# Altium integrated library TerminalBlocksPluggable_5.08mm.IntLib: 266 symbols (part 1 of 2)
Pins are listed as number, name and electrical type; pins without a type are passive.

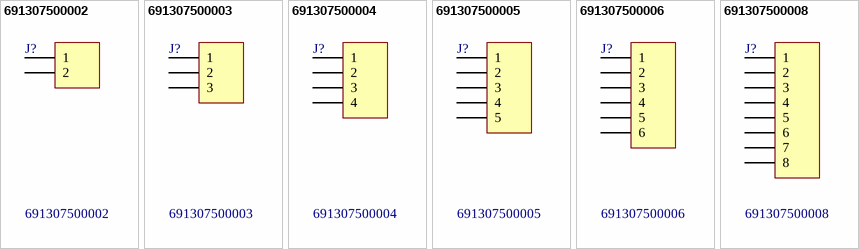
[diagram p0: symbols 691307500002 to 691307500008]

## 691307500002
designator J?
WR-TBL Terminal block - serie 3075; Manufacturer: Würth Elektronik eiSos GmbH; ComponentLink1 Description: Manufacturer; ComponentLink2 Description: Datasheet; NoPins: 02; Created Date: 09 April 2014; partNo: 691307500002; ComponentLink1URL: http://www.we-online.com; ComponentLink2URL: http://katalog.we-online.de/em/datasheet/6913075000xx.pdf; Created by: Karrer Zheng; Value: 691307500002
footprint 691307500002 (5.08 mm Reversed Gender Vertical PCB Header - 02p)
pins: 1, 2

## 691307500003
designator J?
WR-TBL Terminal block - serie 3075; Manufacturer: Würth Elektronik eiSos GmbH; ComponentLink1 Description: Manufacturer; ComponentLink2 Description: Datasheet; NoPins: 03; Created Date: 09 April 2014; partNo: 691307500003; ComponentLink1URL: http://www.we-online.com; ComponentLink2URL: http://katalog.we-online.de/em/datasheet/6913075000xx.pdf; Created by: Karrer Zheng; Value: 691307500003
footprint 691307500003 (5.08 mm Reversed Gender Vertical PCB Header - 03p)
pins: 1, 2, 3

## 691307500004
designator J?
WR-TBL Terminal block - serie 3075; Manufacturer: Würth Elektronik eiSos GmbH; ComponentLink1 Description: Manufacturer; ComponentLink2 Description: Datasheet; NoPins: 04; Created Date: 09 April 2014; partNo: 691307500004; ComponentLink1URL: http://www.we-online.com; ComponentLink2URL: http://katalog.we-online.de/em/datasheet/6913075000xx.pdf; Created by: Karrer Zheng; Value: 691307500004
footprint 691307500004 (5.08 mm Reversed Gender Vertical PCB Header - 04p)
pins: 1, 2, 3, 4

## 691307500005
designator J?
WR-TBL Terminal block - serie 3075; Manufacturer: Würth Elektronik eiSos GmbH; ComponentLink1 Description: Manufacturer; ComponentLink2 Description: Datasheet; NoPins: 05; Created Date: 09 April 2014; partNo: 691307500005; ComponentLink1URL: http://www.we-online.com; ComponentLink2URL: http://katalog.we-online.de/em/datasheet/6913075000xx.pdf; Created by: Karrer Zheng; Value: 691307500005
footprint 691307500005 (5.08 mm Reversed Gender Vertical PCB Header - 05p)
pins: 1, 2, 3, 4, 5

## 691307500006
designator J?
WR-TBL Terminal block - serie 3075; Manufacturer: Würth Elektronik eiSos GmbH; ComponentLink1 Description: Manufacturer; ComponentLink2 Description: Datasheet; NoPins: 06; Created Date: 09 April 2014; partNo: 691307500006; ComponentLink1URL: http://www.we-online.com; ComponentLink2URL: http://katalog.we-online.de/em/datasheet/6913075000xx.pdf; Created by: Karrer Zheng; Value: 691307500006
footprint 691307500006 (5.08 mm Reversed Gender Vertical PCB Header - 06p)
pins: 1, 2, 3, 4, 5, 6

## 691307500008
designator J?
WR-TBL Terminal block - serie 3075; Manufacturer: Würth Elektronik eiSos GmbH; ComponentLink1 Description: Manufacturer; ComponentLink2 Description: Datasheet; NoPins: 08; Created Date: 09 April 2014; partNo: 691307500008; ComponentLink1URL: http://www.we-online.com; ComponentLink2URL: http://katalog.we-online.de/em/datasheet/6913075000xx.pdf; Created by: Karrer Zheng; Value: 691307500008
footprint 691307500008 (5.08 mm Reversed Gender Vertical PCB Header - 08p)
pins: 1, 2, 3, 4, 5, 6, 7, 8


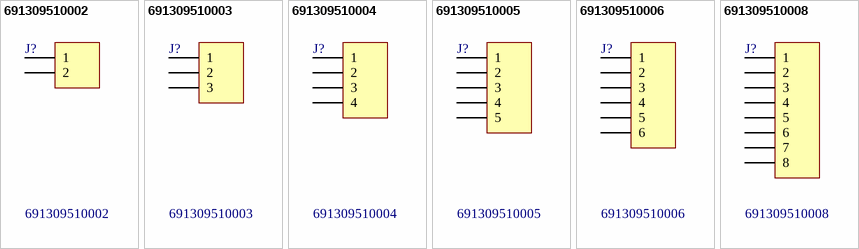
[diagram p1: symbols 691309510002 to 691309510008]

## 691309510002
designator J?
WR-TBL Terminal block - serie 3095; Manufacturer: Würth Elektronik eiSos GmbH; ComponentLink1 Description: Manufacturer; ComponentLink2 Description: Datasheet; NoPins: 02; Created Date: 09 April 2014; partNo: 691309510002; ComponentLink1URL: http://www.we-online.com; ComponentLink2URL: http://katalog.we-online.de/em/datasheet/6913095100xx.pdf; Created by: Karrer Zheng; Value: 691309510002
footprint 691309510002 (5.08 mm Reversed Gender Horizontal PCB Header - 02p)
pins: 1, 2

## 691309510003
designator J?
WR-TBL Terminal block - serie 3095; Manufacturer: Würth Elektronik eiSos GmbH; ComponentLink1 Description: Manufacturer; ComponentLink2 Description: Datasheet; NoPins: 03; Created Date: 09 April 2014; partNo: 691309510003; ComponentLink1URL: http://www.we-online.com; ComponentLink2URL: http://katalog.we-online.de/em/datasheet/6913095100xx.pdf; Created by: Karrer Zheng; Value: 691309510003
footprint 691309510003 (5.08 mm Reversed Gender Horizontal PCB Header - 03p)
pins: 1, 2, 3

## 691309510004
designator J?
WR-TBL Terminal block - serie 3095; Manufacturer: Würth Elektronik eiSos GmbH; ComponentLink1 Description: Manufacturer; ComponentLink2 Description: Datasheet; NoPins: 04; Created Date: 09 April 2014; partNo: 691309510004; ComponentLink1URL: http://www.we-online.com; ComponentLink2URL: http://katalog.we-online.de/em/datasheet/6913095100xx.pdf; Created by: Karrer Zheng; Value: 691309510004
footprint 691309510004 (5.08 mm Reversed Gender Horizontal PCB Header - 04p)
pins: 1, 2, 3, 4

## 691309510005
designator J?
WR-TBL Terminal block - serie 3095; Manufacturer: Würth Elektronik eiSos GmbH; ComponentLink1 Description: Manufacturer; ComponentLink2 Description: Datasheet; NoPins: 05; Created Date: 09 April 2014; partNo: 691309510005; ComponentLink1URL: http://www.we-online.com; ComponentLink2URL: http://katalog.we-online.de/em/datasheet/6913095100xx.pdf; Created by: Karrer Zheng; Value: 691309510005
footprint 691309510005 (5.08 mm Reversed Gender Horizontal PCB Header - 05p)
pins: 1, 2, 3, 4, 5

## 691309510006
designator J?
WR-TBL Terminal block - serie 3095; Manufacturer: Würth Elektronik eiSos GmbH; ComponentLink1 Description: Manufacturer; ComponentLink2 Description: Datasheet; NoPins: 06; Created Date: 09 April 2014; partNo: 691309510006; ComponentLink1URL: http://www.we-online.com; ComponentLink2URL: http://katalog.we-online.de/em/datasheet/6913095100xx.pdf; Created by: Karrer Zheng; Value: 691309510006
footprint 691309510006 (5.08 mm Reversed Gender Horizontal PCB Header - 06p)
pins: 1, 2, 3, 4, 5, 6

## 691309510008
designator J?
WR-TBL Terminal block - serie 3095; Manufacturer: Würth Elektronik eiSos GmbH; ComponentLink1 Description: Manufacturer; ComponentLink2 Description: Datasheet; NoPins: 08; Created Date: 09 April 2014; partNo: 691309510008; ComponentLink1URL: http://www.we-online.com; ComponentLink2URL: http://katalog.we-online.de/em/datasheet/6913095100xx.pdf; Created by: Karrer Zheng; Value: 691309510008
footprint 691309510008 (5.08 mm Reversed Gender Horizontal PCB Header - 08p)
pins: 1, 2, 3, 4, 5, 6, 7, 8


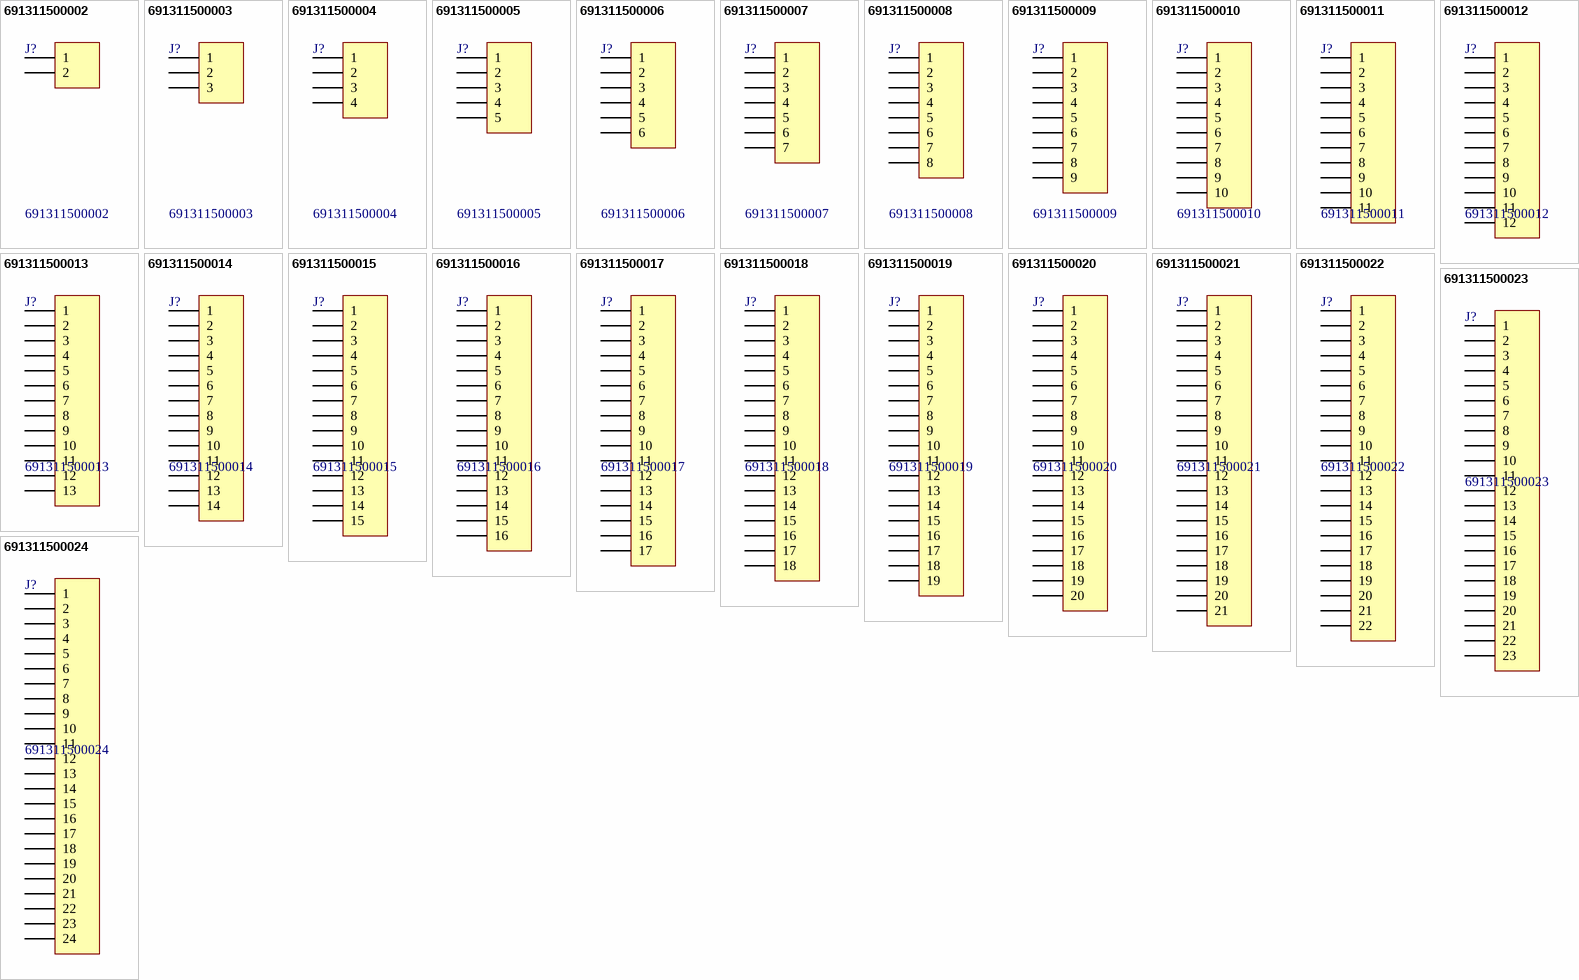
[diagram p2: symbols 691311500002 to 691311500024]

## 691311500002
designator J?
WR-TBL Terminal block - serie 311 - 5.08mm; Manufacturer: Würth Elektronik eiSos GmbH; ComponentLink1 Description: Manufacturer; ComponentLink2 Description: Datasheet; NoPins: 02; Created Date: 9 January 2014; partNo: 691311500002; ComponentLink1URL: http://www.we-online.com; ComponentLink2URL: http://katalog.we-online.de/em/datasheet/6913115000xx.pdf; Created by: Karrer Zheng; Value: 691311500002
footprint 691311500002 (5,08mm - PCB Headers - Vertical - Opened ends -02p)
pins: 1, 2

## 691311500003
designator J?
WR-TBL Terminal block - serie 311 - 5.08mm; Manufacturer: Würth Elektronik eiSos GmbH; ComponentLink1 Description: Manufacturer; ComponentLink2 Description: Datasheet; NoPins: 03; Created Date: 9 January 2014; partNo: 691311500003; ComponentLink1URL: http://www.we-online.com; ComponentLink2URL: http://katalog.we-online.de/em/datasheet/6913115000xx.pdf; Created by: Karrer Zheng; Value: 691311500003
footprint 691311500003 (5,08mm - PCB Headers - Vertical - Opened ends -03p)
pins: 1, 2, 3

## 691311500004
designator J?
WR-TBL Terminal block - serie 311 - 5.08mm; Manufacturer: Würth Elektronik eiSos GmbH; ComponentLink1 Description: Manufacturer; ComponentLink2 Description: Datasheet; NoPins: 04; Created Date: 9 January 2014; partNo: 691311500004; ComponentLink1URL: http://www.we-online.com; ComponentLink2URL: http://katalog.we-online.de/em/datasheet/6913115000xx.pdf; Created by: Karrer Zheng; Value: 691311500004
footprint 691311500004 (5,08mm - PCB Headers - Vertical - Opened ends -04p)
pins: 1, 2, 3, 4

## 691311500005
designator J?
WR-TBL Terminal block - serie 311 - 5.08mm; Manufacturer: Würth Elektronik eiSos GmbH; ComponentLink1 Description: Manufacturer; ComponentLink2 Description: Datasheet; NoPins: 05; Created Date: 9 January 2014; partNo: 691311500005; ComponentLink1URL: http://www.we-online.com; ComponentLink2URL: http://katalog.we-online.de/em/datasheet/6913115000xx.pdf; Created by: Karrer Zheng; Value: 691311500005
footprint 691311500005 (5,08mm - PCB Headers - Vertical - Opened ends -05p)
pins: 1, 2, 3, 4, 5

## 691311500006
designator J?
WR-TBL Terminal block - serie 311 - 5.08mm; Manufacturer: Würth Elektronik eiSos GmbH; ComponentLink1 Description: Manufacturer; ComponentLink2 Description: Datasheet; NoPins: 06; Created Date: 9 January 2014; partNo: 691311500006; ComponentLink1URL: http://www.we-online.com; ComponentLink2URL: http://katalog.we-online.de/em/datasheet/6913115000xx.pdf; Created by: Karrer Zheng; Value: 691311500006
footprint 691311500006 (5,08mm - PCB Headers - Vertical - Opened ends -06p)
pins: 1, 2, 3, 4, 5, 6

## 691311500007
designator J?
WR-TBL Terminal block - serie 311 - 5.08mm; Manufacturer: Würth Elektronik eiSos GmbH; ComponentLink1 Description: Manufacturer; ComponentLink2 Description: Datasheet; NoPins: 07; Created Date: 9 January 2014; partNo: 691311500007; ComponentLink1URL: http://www.we-online.com; ComponentLink2URL: http://katalog.we-online.de/em/datasheet/6913115000xx.pdf; Created by: Karrer Zheng; Value: 691311500007
footprint 691311500007 (5,08mm - PCB Headers - Vertical - Opened ends -07p)
pins: 1, 2, 3, 4, 5, 6, 7

## 691311500008
designator J?
WR-TBL Terminal block - serie 311 - 5.08mm; Manufacturer: Würth Elektronik eiSos GmbH; ComponentLink1 Description: Manufacturer; ComponentLink2 Description: Datasheet; NoPins: 08; Created Date: 9 January 2014; partNo: 691311500008; ComponentLink1URL: http://www.we-online.com; ComponentLink2URL: http://katalog.we-online.de/em/datasheet/6913115000xx.pdf; Created by: Karrer Zheng; Value: 691311500008
footprint 691311500008 (5,08mm - PCB Headers - Vertical - Opened ends -08p)
pins: 1, 2, 3, 4, 5, 6, 7, 8

## 691311500009
designator J?
WR-TBL Terminal block - serie 311 - 5.08mm; Manufacturer: Würth Elektronik eiSos GmbH; ComponentLink1 Description: Manufacturer; ComponentLink2 Description: Datasheet; NoPins: 09; Created Date: 9 January 2014; partNo: 691311500009; ComponentLink1URL: http://www.we-online.com; ComponentLink2URL: http://katalog.we-online.de/em/datasheet/6913115000xx.pdf; Created by: Karrer Zheng; Value: 691311500009
footprint 691311500009 (5,08mm - PCB Headers - Vertical - Opened ends -09p)
pins: 1, 2, 3, 4, 5, 6, 7, 8, 9

## 691311500010
designator J?
WR-TBL Terminal block - serie 311 - 5.08mm; Manufacturer: Würth Elektronik eiSos GmbH; ComponentLink1 Description: Manufacturer; ComponentLink2 Description: Datasheet; NoPins: 10; Created Date: 9 January 2014; partNo: 691311500010; ComponentLink1URL: http://www.we-online.com; ComponentLink2URL: http://katalog.we-online.de/em/datasheet/6913115000xx.pdf; Created by: Karrer Zheng; Value: 691311500010
footprint 691311500010 (5,08mm - PCB Headers - Vertical - Opened ends -10p)
pins: 1, 2, 3, 4, 5, 6, 7, 8, 9, 10

## 691311500011
designator J?
WR-TBL Terminal block - serie 311 - 5.08mm; Manufacturer: Würth Elektronik eiSos GmbH; ComponentLink1 Description: Manufacturer; ComponentLink2 Description: Datasheet; NoPins: 11; Created Date: 9 January 2014; partNo: 691311500011; ComponentLink1URL: http://www.we-online.com; ComponentLink2URL: http://katalog.we-online.de/em/datasheet/6913115000xx.pdf; Created by: Karrer Zheng; Value: 691311500011
footprint 691311500011 (5,08mm - PCB Headers - Vertical - Opened ends -11p)
pins: 1, 2, 3, 4, 5, 6, 7, 8, 9, 10, 11

## 691311500012
designator J?
WR-TBL Terminal block - serie 311 - 5.08mm; Manufacturer: Würth Elektronik eiSos GmbH; ComponentLink1 Description: Manufacturer; ComponentLink2 Description: Datasheet; NoPins: 12; Created Date: 9 January 2014; partNo: 691311500012; ComponentLink1URL: http://www.we-online.com; ComponentLink2URL: http://katalog.we-online.de/em/datasheet/6913115000xx.pdf; Created by: Karrer Zheng; Value: 691311500012
footprint 691311500012 (5,08mm - PCB Headers - Vertical - Opened ends -12p)
pins: 1, 2, 3, 4, 5, 6, 7, 8, 9, 10, 11, 12

## 691311500013
designator J?
WR-TBL Terminal block - serie 311 - 5.08mm; Manufacturer: Würth Elektronik eiSos GmbH; ComponentLink1 Description: Manufacturer; ComponentLink2 Description: Datasheet; NoPins: 13; Created Date: 9 January 2014; partNo: 691311500013; ComponentLink1URL: http://www.we-online.com; ComponentLink2URL: http://katalog.we-online.de/em/datasheet/6913115000xx.pdf; Created by: Karrer Zheng; Value: 691311500013
footprint 691311500013 (5,08mm - PCB Headers - Vertical - Opened ends -13p)
pins: 1, 2, 3, 4, 5, 6, 7, 8, 9, 10, 11, 12, 13

## 691311500014
designator J?
WR-TBL Terminal block - serie 311 - 5.08mm; Manufacturer: Würth Elektronik eiSos GmbH; ComponentLink1 Description: Manufacturer; ComponentLink2 Description: Datasheet; NoPins: 14; Created Date: 9 January 2014; partNo: 691311500014; ComponentLink1URL: http://www.we-online.com; ComponentLink2URL: http://katalog.we-online.de/em/datasheet/6913115000xx.pdf; Created by: Karrer Zheng; Value: 691311500014
footprint 691311500014 (5,08mm - PCB Headers - Vertical - Opened ends -14p)
pins: 1, 2, 3, 4, 5, 6, 7, 8, 9, 10, 11, 12, 13, 14

## 691311500015
designator J?
WR-TBL Terminal block - serie 311 - 5.08mm; Manufacturer: Würth Elektronik eiSos GmbH; ComponentLink1 Description: Manufacturer; ComponentLink2 Description: Datasheet; NoPins: 15; Created Date: 9 January 2014; partNo: 691311500015; ComponentLink1URL: http://www.we-online.com; ComponentLink2URL: http://katalog.we-online.de/em/datasheet/6913115000xx.pdf; Created by: Karrer Zheng; Value: 691311500015
footprint 691311500015 (5,08mm - PCB Headers - Vertical - Opened ends -15p)
pins: 1, 2, 3, 4, 5, 6, 7, 8, 9, 10, 11, 12, 13, 14, 15

## 691311500016
designator J?
WR-TBL Terminal block - serie 311 - 5.08mm; Manufacturer: Würth Elektronik eiSos GmbH; ComponentLink1 Description: Manufacturer; ComponentLink2 Description: Datasheet; NoPins: 16; Created Date: 9 January 2014; partNo: 691311500016; ComponentLink1URL: http://www.we-online.com; ComponentLink2URL: http://katalog.we-online.de/em/datasheet/6913115000xx.pdf; Created by: Karrer Zheng; Value: 691311500016
footprint 691311500016 (5,08mm - PCB Headers - Vertical - Opened ends -16p)
pins: 1, 2, 3, 4, 5, 6, 7, 8, 9, 10, 11, 12, 13, 14, 15, 16

## 691311500017
designator J?
WR-TBL Terminal block - serie 311 - 5.08mm; Manufacturer: Würth Elektronik eiSos GmbH; ComponentLink1 Description: Manufacturer; ComponentLink2 Description: Datasheet; NoPins: 17; Created Date: 9 January 2014; partNo: 691311500017; ComponentLink1URL: http://www.we-online.com; ComponentLink2URL: http://katalog.we-online.de/em/datasheet/6913115000xx.pdf; Created by: Karrer Zheng; Value: 691311500017
footprint 691311500017 (5,08mm - PCB Headers - Vertical - Opened ends -17p)
pins: 1, 2, 3, 4, 5, 6, 7, 8, 9, 10, 11, 12, 13, 14, 15, 16, 17

## 691311500018
designator J?
WR-TBL Terminal block - serie 311 - 5.08mm; Manufacturer: Würth Elektronik eiSos GmbH; ComponentLink1 Description: Manufacturer; ComponentLink2 Description: Datasheet; NoPins: 18; Created Date: 9 January 2014; partNo: 691311500018; ComponentLink1URL: http://www.we-online.com; ComponentLink2URL: http://katalog.we-online.de/em/datasheet/6913115000xx.pdf; Created by: Karrer Zheng; Value: 691311500018
footprint 691311500018 (5,08mm - PCB Headers - Vertical - Opened ends -18p)
pins: 1, 2, 3, 4, 5, 6, 7, 8, 9, 10, 11, 12, 13, 14, 15, 16, 17, 18

## 691311500019
designator J?
WR-TBL Terminal block - serie 311 - 5.08mm; Manufacturer: Würth Elektronik eiSos GmbH; ComponentLink1 Description: Manufacturer; ComponentLink2 Description: Datasheet; NoPins: 19; Created Date: 9 January 2014; partNo: 691311500019; ComponentLink1URL: http://www.we-online.com; ComponentLink2URL: http://katalog.we-online.de/em/datasheet/6913115000xx.pdf; Created by: Karrer Zheng; Value: 691311500019
footprint 691311500019 (5,08mm - PCB Headers - Vertical - Opened ends -19p)
pins: 1, 2, 3, 4, 5, 6, 7, 8, 9, 10, 11, 12, 13, 14, 15, 16, 17, 18, 19

## 691311500020
designator J?
WR-TBL Terminal block - serie 311 - 5.08mm; Manufacturer: Würth Elektronik eiSos GmbH; ComponentLink1 Description: Manufacturer; ComponentLink2 Description: Datasheet; NoPins: 20; Created Date: 9 January 2014; partNo: 691311500020; ComponentLink1URL: http://www.we-online.com; ComponentLink2URL: http://katalog.we-online.de/em/datasheet/6913115000xx.pdf; Created by: Karrer Zheng; Value: 691311500020
footprint 691311500020 (5,08mm - PCB Headers - Vertical - Opened ends -20p)
pins: 1, 2, 3, 4, 5, 6, 7, 8, 9, 10, 11, 12, 13, 14, 15, 16, 17, 18, 19, 20

## 691311500021
designator J?
WR-TBL Terminal block - serie 311 - 5.08mm; Manufacturer: Würth Elektronik eiSos GmbH; ComponentLink1 Description: Manufacturer; ComponentLink2 Description: Datasheet; NoPins: 21; Created Date: 9 January 2014; partNo: 691311500021; ComponentLink1URL: http://www.we-online.com; ComponentLink2URL: http://katalog.we-online.de/em/datasheet/6913115000xx.pdf; Created by: Karrer Zheng; Value: 691311500021
footprint 691311500021 (5,08mm - PCB Headers - Vertical - Opened ends -21p)
pins: 1, 2, 3, 4, 5, 6, 7, 8, 9, 10, 11, 12, 13, 14, 15, 16, 17, 18, 19, 20, 21

## 691311500022
designator J?
WR-TBL Terminal block - serie 311 - 5.08mm; Manufacturer: Würth Elektronik eiSos GmbH; ComponentLink1 Description: Manufacturer; ComponentLink2 Description: Datasheet; NoPins: 22; Created Date: 9 January 2014; partNo: 691311500022; ComponentLink1URL: http://www.we-online.com; ComponentLink2URL: http://katalog.we-online.de/em/datasheet/6913115000xx.pdf; Created by: Karrer Zheng; Value: 691311500022
footprint 691311500022 (5,08mm - PCB Headers - Vertical - Opened ends -22p)
pins: 1, 2, 3, 4, 5, 6, 7, 8, 9, 10, 11, 12, 13, 14, 15, 16, 17, 18, 19, 20, 21, 22

## 691311500023
designator J?
WR-TBL Terminal block - serie 311 - 5.08mm; Manufacturer: Würth Elektronik eiSos GmbH; ComponentLink1 Description: Manufacturer; ComponentLink2 Description: Datasheet; NoPins: 23; Created Date: 9 January 2014; partNo: 691311500023; ComponentLink1URL: http://www.we-online.com; ComponentLink2URL: http://katalog.we-online.de/em/datasheet/6913115000xx.pdf; Created by: Karrer Zheng; Value: 691311500023
footprint 691311500023 (5,08mm - PCB Headers - Vertical - Opened ends -23p)
pins: 1, 2, 3, 4, 5, 6, 7, 8, 9, 10, 11, 12, 13, 14, 15, 16, 17, 18, 19, 20, 21, 22, 23

## 691311500024
designator J?
WR-TBL Terminal block - serie 311 - 5.08mm; Manufacturer: Würth Elektronik eiSos GmbH; ComponentLink1 Description: Manufacturer; ComponentLink2 Description: Datasheet; NoPins: 24; Created Date: 9 January 2014; partNo: 691311500024; ComponentLink1URL: http://www.we-online.com; ComponentLink2URL: http://katalog.we-online.de/em/datasheet/6913115000xx.pdf; Created by: Karrer Zheng; Value: 691311500024
footprint 691311500024 (5,08mm - PCB Headers - Vertical - Opened ends -24p)
pins: 1, 2, 3, 4, 5, 6, 7, 8, 9, 10, 11, 12, 13, 14, 15, 16, 17, 18, 19, 20, 21, 22, 23, 24


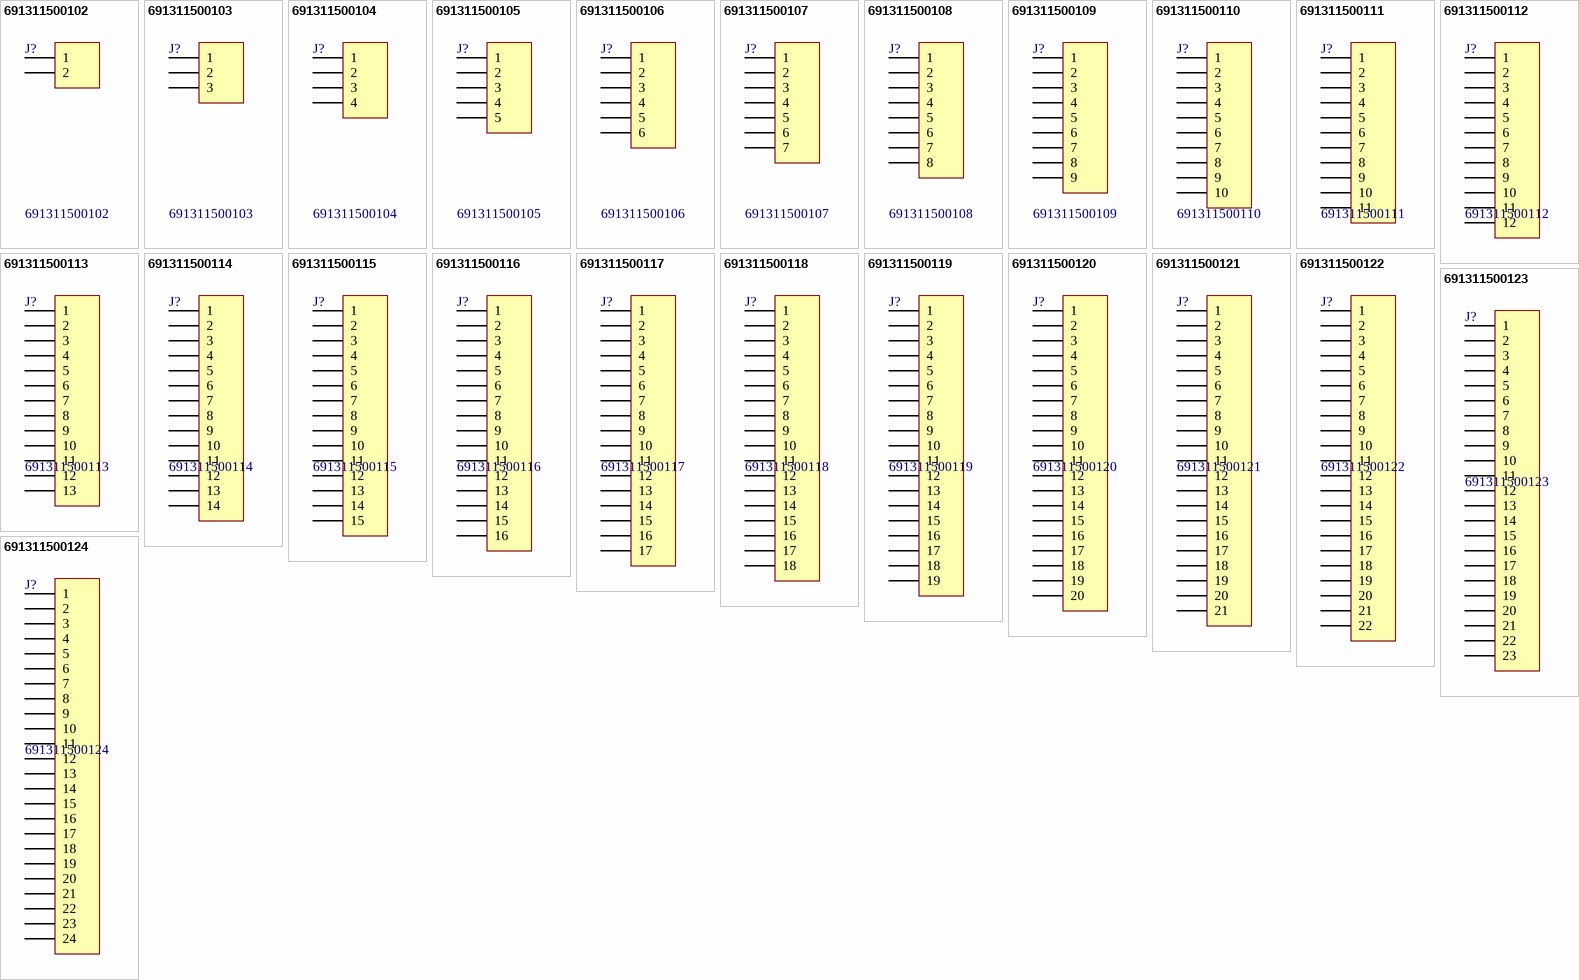
[diagram p3: symbols 691311500102 to 691311500124]

## 691311500102
designator J?
WR-TBL Terminal block - serie 311 Closed - 5.08mm; Manufacturer: Würth Elektronik eiSos GmbH; ComponentLink1 Description: Manufacturer; ComponentLink2 Description: Datasheet; NoPins: 02; Created Date: 8 January 2014; partNo: 691311500102; ComponentLink1URL: http://www.we-online.com; ComponentLink2URL: http://katalog.we-online.de/em/datasheet/6913115001xx.pdf; Created by: Karrer Zheng; Value: 691311500102
footprint 691311500102 (5,08mm - PCB Headers - Vertical - Closed ends -02p)
pins: 1, 2

## 691311500103
designator J?
WR-TBL Terminal block - serie 311 Closed - 5.08mm; Manufacturer: Würth Elektronik eiSos GmbH; ComponentLink1 Description: Manufacturer; ComponentLink2 Description: Datasheet; NoPins: 03; Created Date: 8 January 2014; partNo: 691311500103; ComponentLink1URL: http://www.we-online.com; ComponentLink2URL: http://katalog.we-online.de/em/datasheet/6913115001xx.pdf; Created by: Karrer Zheng; Value: 691311500103
footprint 691311500103 (5,08mm - PCB Headers - Vertical - Closed ends -03p)
pins: 1, 2, 3

## 691311500104
designator J?
WR-TBL Terminal block - serie 311 Closed - 5.08mm; Manufacturer: Würth Elektronik eiSos GmbH; ComponentLink1 Description: Manufacturer; ComponentLink2 Description: Datasheet; NoPins: 04; Created Date: 8 January 2014; partNo: 691311500104; ComponentLink1URL: http://www.we-online.com; ComponentLink2URL: http://katalog.we-online.de/em/datasheet/6913115001xx.pdf; Created by: Karrer Zheng; Value: 691311500104
footprint 691311500104 (5,08mm - PCB Headers - Vertical - Closed ends -04p)
pins: 1, 2, 3, 4

## 691311500105
designator J?
WR-TBL Terminal block - serie 311 Closed - 5.08mm; Manufacturer: Würth Elektronik eiSos GmbH; ComponentLink1 Description: Manufacturer; ComponentLink2 Description: Datasheet; NoPins: 05; Created Date: 8 January 2014; partNo: 691311500105; ComponentLink1URL: http://www.we-online.com; ComponentLink2URL: http://katalog.we-online.de/em/datasheet/6913115001xx.pdf; Created by: Karrer Zheng; Value: 691311500105
footprint 691311500105 (5,08mm - PCB Headers - Vertical - Closed ends -05p)
pins: 1, 2, 3, 4, 5

## 691311500106
designator J?
WR-TBL Terminal block - serie 311 Closed - 5.08mm; Manufacturer: Würth Elektronik eiSos GmbH; ComponentLink1 Description: Manufacturer; ComponentLink2 Description: Datasheet; NoPins: 06; Created Date: 8 January 2014; partNo: 691311500106; ComponentLink1URL: http://www.we-online.com; ComponentLink2URL: http://katalog.we-online.de/em/datasheet/6913115001xx.pdf; Created by: Karrer Zheng; Value: 691311500106
footprint 691311500106 (5,08mm - PCB Headers - Vertical - Closed ends -06p)
pins: 1, 2, 3, 4, 5, 6

## 691311500107
designator J?
WR-TBL Terminal block - serie 311 Closed - 5.08mm; Manufacturer: Würth Elektronik eiSos GmbH; ComponentLink1 Description: Manufacturer; ComponentLink2 Description: Datasheet; NoPins: 07; Created Date: 8 January 2014; partNo: 691311500107; ComponentLink1URL: http://www.we-online.com; ComponentLink2URL: http://katalog.we-online.de/em/datasheet/6913115001xx.pdf; Created by: Karrer Zheng; Value: 691311500107
footprint 691311500107 (5,08mm - PCB Headers - Vertical - Closed ends -07p)
pins: 1, 2, 3, 4, 5, 6, 7

## 691311500108
designator J?
WR-TBL Terminal block - serie 311 Closed - 5.08mm; Manufacturer: Würth Elektronik eiSos GmbH; ComponentLink1 Description: Manufacturer; ComponentLink2 Description: Datasheet; NoPins: 08; Created Date: 8 January 2014; partNo: 691311500108; ComponentLink1URL: http://www.we-online.com; ComponentLink2URL: http://katalog.we-online.de/em/datasheet/6913115001xx.pdf; Created by: Karrer Zheng; Value: 691311500108
footprint 691311500108 (5,08mm - PCB Headers - Vertical - Closed ends -08p)
pins: 1, 2, 3, 4, 5, 6, 7, 8

## 691311500109
designator J?
WR-TBL Terminal block - serie 311 Closed - 5.08mm; Manufacturer: Würth Elektronik eiSos GmbH; ComponentLink1 Description: Manufacturer; ComponentLink2 Description: Datasheet; NoPins: 09; Created Date: 8 January 2014; partNo: 691311500109; ComponentLink1URL: http://www.we-online.com; ComponentLink2URL: http://katalog.we-online.de/em/datasheet/6913115001xx.pdf; Created by: Karrer Zheng; Value: 691311500109
footprint 691311500109 (5,08mm - PCB Headers - Vertical - Closed ends -09p)
pins: 1, 2, 3, 4, 5, 6, 7, 8, 9

## 691311500110
designator J?
WR-TBL Terminal block - serie 311 Closed - 5.08mm; Manufacturer: Würth Elektronik eiSos GmbH; ComponentLink1 Description: Manufacturer; ComponentLink2 Description: Datasheet; NoPins: 10; Created Date: 8 January 2014; partNo: 691311500110; ComponentLink1URL: http://www.we-online.com; ComponentLink2URL: http://katalog.we-online.de/em/datasheet/6913115001xx.pdf; Created by: Karrer Zheng; Value: 691311500110
footprint 691311500110 (5,08mm - PCB Headers - Vertical - Closed ends -10p)
pins: 1, 2, 3, 4, 5, 6, 7, 8, 9, 10

## 691311500111
designator J?
WR-TBL Terminal block - serie 311 Closed - 5.08mm; Manufacturer: Würth Elektronik eiSos GmbH; ComponentLink1 Description: Manufacturer; ComponentLink2 Description: Datasheet; NoPins: 11; Created Date: 8 January 2014; partNo: 691311500111; ComponentLink1URL: http://www.we-online.com; ComponentLink2URL: http://katalog.we-online.de/em/datasheet/6913115001xx.pdf; Created by: Karrer Zheng; Value: 691311500111
footprint 691311500111 (5,08mm - PCB Headers - Vertical - Closed ends -11p)
pins: 1, 2, 3, 4, 5, 6, 7, 8, 9, 10, 11

## 691311500112
designator J?
WR-TBL Terminal block - serie 311 Closed - 5.08mm; Manufacturer: Würth Elektronik eiSos GmbH; ComponentLink1 Description: Manufacturer; ComponentLink2 Description: Datasheet; NoPins: 12; Created Date: 8 January 2014; partNo: 691311500112; ComponentLink1URL: http://www.we-online.com; ComponentLink2URL: http://katalog.we-online.de/em/datasheet/6913115001xx.pdf; Created by: Karrer Zheng; Value: 691311500112
footprint 691311500112 (5,08mm - PCB Headers - Vertical - Closed ends -12p)
pins: 1, 2, 3, 4, 5, 6, 7, 8, 9, 10, 11, 12

## 691311500113
designator J?
WR-TBL Terminal block - serie 311 Closed - 5.08mm; Manufacturer: Würth Elektronik eiSos GmbH; ComponentLink1 Description: Manufacturer; ComponentLink2 Description: Datasheet; NoPins: 13; Created Date: 8 January 2014; partNo: 691311500113; ComponentLink1URL: http://www.we-online.com; ComponentLink2URL: http://katalog.we-online.de/em/datasheet/6913115001xx.pdf; Created by: Karrer Zheng; Value: 691311500113
footprint 691311500113 (5,08mm - PCB Headers - Vertical - Closed ends -13p)
pins: 1, 2, 3, 4, 5, 6, 7, 8, 9, 10, 11, 12, 13

## 691311500114
designator J?
WR-TBL Terminal block - serie 311 Closed - 5.08mm; Manufacturer: Würth Elektronik eiSos GmbH; ComponentLink1 Description: Manufacturer; ComponentLink2 Description: Datasheet; NoPins: 14; Created Date: 8 January 2014; partNo: 691311500114; ComponentLink1URL: http://www.we-online.com; ComponentLink2URL: http://katalog.we-online.de/em/datasheet/6913115001xx.pdf; Created by: Karrer Zheng; Value: 691311500114
footprint 691311500114 (5,08mm - PCB Headers - Vertical - Closed ends -14p)
pins: 1, 2, 3, 4, 5, 6, 7, 8, 9, 10, 11, 12, 13, 14

## 691311500115
designator J?
WR-TBL Terminal block - serie 311 Closed - 5.08mm; Manufacturer: Würth Elektronik eiSos GmbH; ComponentLink1 Description: Manufacturer; ComponentLink2 Description: Datasheet; NoPins: 15; Created Date: 8 January 2014; partNo: 691311500115; ComponentLink1URL: http://www.we-online.com; ComponentLink2URL: http://katalog.we-online.de/em/datasheet/6913115001xx.pdf; Created by: Karrer Zheng; Value: 691311500115
footprint 691311500115 (5,08mm - PCB Headers - Vertical - Closed ends -15p)
pins: 1, 2, 3, 4, 5, 6, 7, 8, 9, 10, 11, 12, 13, 14, 15

## 691311500116
designator J?
WR-TBL Terminal block - serie 311 Closed - 5.08mm; Manufacturer: Würth Elektronik eiSos GmbH; ComponentLink1 Description: Manufacturer; ComponentLink2 Description: Datasheet; NoPins: 16; Created Date: 8 January 2014; partNo: 691311500116; ComponentLink1URL: http://www.we-online.com; ComponentLink2URL: http://katalog.we-online.de/em/datasheet/6913115001xx.pdf; Created by: Karrer Zheng; Value: 691311500116
footprint 691311500116 (5,08mm - PCB Headers - Vertical - Closed ends -16p)
pins: 1, 2, 3, 4, 5, 6, 7, 8, 9, 10, 11, 12, 13, 14, 15, 16

## 691311500117
designator J?
WR-TBL Terminal block - serie 311 Closed - 5.08mm; Manufacturer: Würth Elektronik eiSos GmbH; ComponentLink1 Description: Manufacturer; ComponentLink2 Description: Datasheet; NoPins: 17; Created Date: 8 January 2014; partNo: 691311500117; ComponentLink1URL: http://www.we-online.com; ComponentLink2URL: http://katalog.we-online.de/em/datasheet/6913115001xx.pdf; Created by: Karrer Zheng; Value: 691311500117
footprint 691311500117 (5,08mm - PCB Headers - Vertical - Closed ends -17p)
pins: 1, 2, 3, 4, 5, 6, 7, 8, 9, 10, 11, 12, 13, 14, 15, 16, 17

## 691311500118
designator J?
WR-TBL Terminal block - serie 311 Closed - 5.08mm; Manufacturer: Würth Elektronik eiSos GmbH; ComponentLink1 Description: Manufacturer; ComponentLink2 Description: Datasheet; NoPins: 18; Created Date: 8 January 2014; partNo: 691311500118; ComponentLink1URL: http://www.we-online.com; ComponentLink2URL: http://katalog.we-online.de/em/datasheet/6913115001xx.pdf; Created by: Karrer Zheng; Value: 691311500118
footprint 691311500118 (5,08mm - PCB Headers - Vertical - Closed ends -18p)
pins: 1, 2, 3, 4, 5, 6, 7, 8, 9, 10, 11, 12, 13, 14, 15, 16, 17, 18

## 691311500119
designator J?
WR-TBL Terminal block - serie 311 Closed - 5.08mm; Manufacturer: Würth Elektronik eiSos GmbH; ComponentLink1 Description: Manufacturer; ComponentLink2 Description: Datasheet; NoPins: 19; Created Date: 8 January 2014; partNo: 691311500119; ComponentLink1URL: http://www.we-online.com; ComponentLink2URL: http://katalog.we-online.de/em/datasheet/6913115001xx.pdf; Created by: Karrer Zheng; Value: 691311500119
footprint 691311500119 (5,08mm - PCB Headers - Vertical - Closed ends -19p)
pins: 1, 2, 3, 4, 5, 6, 7, 8, 9, 10, 11, 12, 13, 14, 15, 16, 17, 18, 19

## 691311500120
designator J?
WR-TBL Terminal block - serie 311 Closed - 5.08mm; Manufacturer: Würth Elektronik eiSos GmbH; ComponentLink1 Description: Manufacturer; ComponentLink2 Description: Datasheet; NoPins: 20; Created Date: 8 January 2014; partNo: 691311500120; ComponentLink1URL: http://www.we-online.com; ComponentLink2URL: http://katalog.we-online.de/em/datasheet/6913115001xx.pdf; Created by: Karrer Zheng; Value: 691311500120
footprint 691311500120 (5,08mm - PCB Headers - Vertical - Closed ends -20p)
pins: 1, 2, 3, 4, 5, 6, 7, 8, 9, 10, 11, 12, 13, 14, 15, 16, 17, 18, 19, 20

## 691311500121
designator J?
WR-TBL Terminal block - serie 311 Closed - 5.08mm; Manufacturer: Würth Elektronik eiSos GmbH; ComponentLink1 Description: Manufacturer; ComponentLink2 Description: Datasheet; NoPins: 21; Created Date: 8 January 2014; partNo: 691311500121; ComponentLink1URL: http://www.we-online.com; ComponentLink2URL: http://katalog.we-online.de/em/datasheet/6913115001xx.pdf; Created by: Karrer Zheng; Value: 691311500121
footprint 691311500121 (5,08mm - PCB Headers - Vertical - Closed ends -21p)
pins: 1, 2, 3, 4, 5, 6, 7, 8, 9, 10, 11, 12, 13, 14, 15, 16, 17, 18, 19, 20, 21

## 691311500122
designator J?
WR-TBL Terminal block - serie 311 Closed - 5.08mm; Manufacturer: Würth Elektronik eiSos GmbH; ComponentLink1 Description: Manufacturer; ComponentLink2 Description: Datasheet; NoPins: 22; Created Date: 8 January 2014; partNo: 691311500122; ComponentLink1URL: http://www.we-online.com; ComponentLink2URL: http://katalog.we-online.de/em/datasheet/6913115001xx.pdf; Created by: Karrer Zheng; Value: 691311500122
footprint 691311500122 (5,08mm - PCB Headers - Vertical - Closed ends -22p)
pins: 1, 2, 3, 4, 5, 6, 7, 8, 9, 10, 11, 12, 13, 14, 15, 16, 17, 18, 19, 20, 21, 22

## 691311500123
designator J?
WR-TBL Terminal block - serie 311 Closed - 5.08mm; Manufacturer: Würth Elektronik eiSos GmbH; ComponentLink1 Description: Manufacturer; ComponentLink2 Description: Datasheet; NoPins: 23; Created Date: 8 January 2014; partNo: 691311500123; ComponentLink1URL: http://www.we-online.com; ComponentLink2URL: http://katalog.we-online.de/em/datasheet/6913115001xx.pdf; Created by: Karrer Zheng; Value: 691311500123
footprint 691311500123 (5,08mm - PCB Headers - Vertical - Closed ends -23p)
pins: 1, 2, 3, 4, 5, 6, 7, 8, 9, 10, 11, 12, 13, 14, 15, 16, 17, 18, 19, 20, 21, 22, 23

## 691311500124
designator J?
WR-TBL Terminal block - serie 311 Closed - 5.08mm; Manufacturer: Würth Elektronik eiSos GmbH; ComponentLink1 Description: Manufacturer; ComponentLink2 Description: Datasheet; NoPins: 24; Created Date: 8 January 2014; partNo: 691311500124; ComponentLink1URL: http://www.we-online.com; ComponentLink2URL: http://katalog.we-online.de/em/datasheet/6913115001xx.pdf; Created by: Karrer Zheng; Value: 691311500124
footprint 691311500124 (5,08mm - PCB Headers - Vertical - Closed ends -24p)
pins: 1, 2, 3, 4, 5, 6, 7, 8, 9, 10, 11, 12, 13, 14, 15, 16, 17, 18, 19, 20, 21, 22, 23, 24


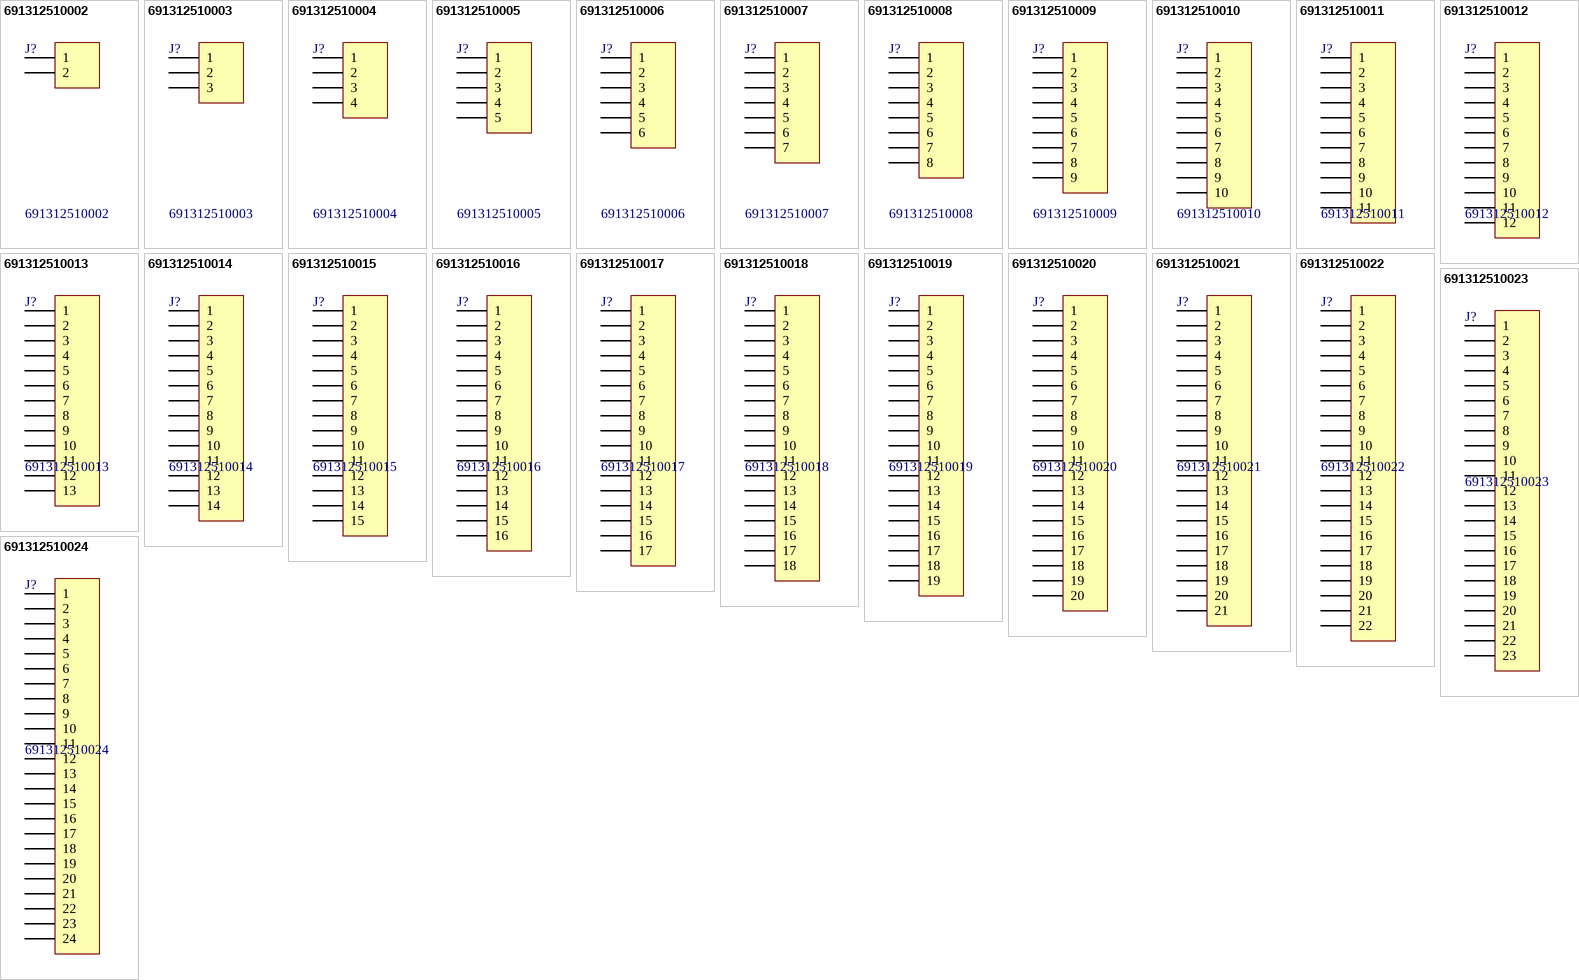
[diagram p4: symbols 691312510002 to 691312510024]

## 691312510002
designator J?
WR-TBL Terminal Blocks Serie 312 – 5.08 mm; Manufacturer: Würth Elektronik eiSos GmbH; ComponentLink1 Description: Manufacturer; ComponentLink2 Description: Datasheet; NoPins: 02; Created Date: 31 March 2014; partNo: 691312510002; ComponentLink1URL: http://www.we-online.com; ComponentLink2URL: http://katalog.we-online.de/em/datasheet/6913125100xx.pdf; Created by: Karrer Zheng; Value: 691312510002
footprint 691312510002 (5,08mm - PCB Headers - Horizontal - Opened ends - 02p)
pins: 1, 2

## 691312510003
designator J?
WR-TBL Terminal Blocks Serie 312 – 5.08 mm; Manufacturer: Würth Elektronik eiSos GmbH; ComponentLink1 Description: Manufacturer; ComponentLink2 Description: Datasheet; NoPins: 03; Created Date: 31 March 2014; partNo: 691312510003; ComponentLink1URL: http://www.we-online.com; ComponentLink2URL: http://katalog.we-online.de/em/datasheet/6913125100xx.pdf; Created by: Karrer Zheng; Value: 691312510003
footprint 691312510003 (5,08mm - PCB Headers - Horizontal - Opened ends - 03p)
pins: 1, 2, 3

## 691312510004
designator J?
WR-TBL Terminal Blocks Serie 312 – 5.08 mm; Manufacturer: Würth Elektronik eiSos GmbH; ComponentLink1 Description: Manufacturer; ComponentLink2 Description: Datasheet; NoPins: 04; Created Date: 31 March 2014; partNo: 691312510004; ComponentLink1URL: http://www.we-online.com; ComponentLink2URL: http://katalog.we-online.de/em/datasheet/6913125100xx.pdf; Created by: Karrer Zheng; Value: 691312510004
footprint 691312510004 (5,08mm - PCB Headers - Horizontal - Opened ends - 04p)
pins: 1, 2, 3, 4

## 691312510005
designator J?
WR-TBL Terminal Blocks Serie 312 – 5.08 mm; Manufacturer: Würth Elektronik eiSos GmbH; ComponentLink1 Description: Manufacturer; ComponentLink2 Description: Datasheet; NoPins: 05; Created Date: 31 March 2014; partNo: 691312510005; ComponentLink1URL: http://www.we-online.com; ComponentLink2URL: http://katalog.we-online.de/em/datasheet/6913125100xx.pdf; Created by: Karrer Zheng; Value: 691312510005
footprint 691312510005 (5,08mm - PCB Headers - Horizontal - Opened ends - 05p)
pins: 1, 2, 3, 4, 5

## 691312510006
designator J?
WR-TBL Terminal Blocks Serie 312 – 5.08 mm; Manufacturer: Würth Elektronik eiSos GmbH; ComponentLink1 Description: Manufacturer; ComponentLink2 Description: Datasheet; NoPins: 06; Created Date: 31 March 2014; partNo: 691312510006; ComponentLink1URL: http://www.we-online.com; ComponentLink2URL: http://katalog.we-online.de/em/datasheet/6913125100xx.pdf; Created by: Karrer Zheng; Value: 691312510006
footprint 691312510006 (5,08mm - PCB Headers - Horizontal - Opened ends - 06p)
pins: 1, 2, 3, 4, 5, 6

## 691312510007
designator J?
WR-TBL Terminal Blocks Serie 312 – 5.08 mm; Manufacturer: Würth Elektronik eiSos GmbH; ComponentLink1 Description: Manufacturer; ComponentLink2 Description: Datasheet; NoPins: 07; Created Date: 31 March 2014; partNo: 691312510007; ComponentLink1URL: http://www.we-online.com; ComponentLink2URL: http://katalog.we-online.de/em/datasheet/6913125100xx.pdf; Created by: Karrer Zheng; Value: 691312510007
footprint 691312510007 (5,08mm - PCB Headers - Horizontal - Opened ends - 07p)
pins: 1, 2, 3, 4, 5, 6, 7

## 691312510008
designator J?
WR-TBL Terminal Blocks Serie 312 – 5.08 mm; Manufacturer: Würth Elektronik eiSos GmbH; ComponentLink1 Description: Manufacturer; ComponentLink2 Description: Datasheet; NoPins: 08; Created Date: 31 March 2014; partNo: 691312510008; ComponentLink1URL: http://www.we-online.com; ComponentLink2URL: http://katalog.we-online.de/em/datasheet/6913125100xx.pdf; Created by: Karrer Zheng; Value: 691312510008
footprint 691312510008 (5,08mm - PCB Headers - Horizontal - Opened ends - 08p)
pins: 1, 2, 3, 4, 5, 6, 7, 8

## 691312510009
designator J?
WR-TBL Terminal Blocks Serie 312 – 5.08 mm; Manufacturer: Würth Elektronik eiSos GmbH; ComponentLink1 Description: Manufacturer; ComponentLink2 Description: Datasheet; NoPins: 09; Created Date: 31 March 2014; partNo: 691312510009; ComponentLink1URL: http://www.we-online.com; ComponentLink2URL: http://katalog.we-online.de/em/datasheet/6913125100xx.pdf; Created by: Karrer Zheng; Value: 691312510009
footprint 691312510009 (5,08mm - PCB Headers - Horizontal - Opened ends - 09p)
pins: 1, 2, 3, 4, 5, 6, 7, 8, 9

## 691312510010
designator J?
WR-TBL Terminal Blocks Serie 312 – 5.08 mm; Manufacturer: Würth Elektronik eiSos GmbH; ComponentLink1 Description: Manufacturer; ComponentLink2 Description: Datasheet; NoPins: 10; Created Date: 31 March 2014; partNo: 691312510010; ComponentLink1URL: http://www.we-online.com; ComponentLink2URL: http://katalog.we-online.de/em/datasheet/6913125100xx.pdf; Created by: Karrer Zheng; Value: 691312510010
footprint 691312510010 (5,08mm - PCB Headers - Horizontal - Opened ends - 10p)
pins: 1, 2, 3, 4, 5, 6, 7, 8, 9, 10

## 691312510011
designator J?
WR-TBL Terminal Blocks Serie 312 – 5.08 mm; Manufacturer: Würth Elektronik eiSos GmbH; ComponentLink1 Description: Manufacturer; ComponentLink2 Description: Datasheet; NoPins: 11; Created Date: 31 March 2014; partNo: 691312510011; ComponentLink1URL: http://www.we-online.com; ComponentLink2URL: http://katalog.we-online.de/em/datasheet/6913125100xx.pdf; Created by: Karrer Zheng; Value: 691312510011
footprint 691312510011 (5,08mm - PCB Headers - Horizontal - Opened ends - 11p)
pins: 1, 2, 3, 4, 5, 6, 7, 8, 9, 10, 11

## 691312510012
designator J?
WR-TBL Terminal Blocks Serie 312 – 5.08 mm; Manufacturer: Würth Elektronik eiSos GmbH; ComponentLink1 Description: Manufacturer; ComponentLink2 Description: Datasheet; NoPins: 12; Created Date: 31 March 2014; partNo: 691312510012; ComponentLink1URL: http://www.we-online.com; ComponentLink2URL: http://katalog.we-online.de/em/datasheet/6913125100xx.pdf; Created by: Karrer Zheng; Value: 691312510012
footprint 691312510012 (5,08mm - PCB Headers - Horizontal - Opened ends - 12p)
pins: 1, 2, 3, 4, 5, 6, 7, 8, 9, 10, 11, 12

## 691312510013
designator J?
WR-TBL Terminal Blocks Serie 312 – 5.08 mm; Manufacturer: Würth Elektronik eiSos GmbH; ComponentLink1 Description: Manufacturer; ComponentLink2 Description: Datasheet; NoPins: 13; Created Date: 31 March 2014; partNo: 691312510013; ComponentLink1URL: http://www.we-online.com; ComponentLink2URL: http://katalog.we-online.de/em/datasheet/6913125100xx.pdf; Created by: Karrer Zheng; Value: 691312510013
footprint 691312510013 (5,08mm - PCB Headers - Horizontal - Opened ends - 13p)
pins: 1, 2, 3, 4, 5, 6, 7, 8, 9, 10, 11, 12, 13

## 691312510014
designator J?
WR-TBL Terminal Blocks Serie 312 – 5.08 mm; Manufacturer: Würth Elektronik eiSos GmbH; ComponentLink1 Description: Manufacturer; ComponentLink2 Description: Datasheet; NoPins: 14; Created Date: 31 March 2014; partNo: 691312510014; ComponentLink1URL: http://www.we-online.com; ComponentLink2URL: http://katalog.we-online.de/em/datasheet/6913125100xx.pdf; Created by: Karrer Zheng; Value: 691312510014
footprint 691312510014 (5,08mm - PCB Headers - Horizontal - Opened ends - 14p)
pins: 1, 2, 3, 4, 5, 6, 7, 8, 9, 10, 11, 12, 13, 14
